# Altium footprint library Connector_Samtec_HLE_SMD.PcbLib: 290 footprints (part 15 of 24) (continued)
## Samtec_HLE-137-02-xxx-DV-LC_2x37_P2.54mm_Horizontal [mm] (continued)
F.CrtYd:
  lines w0.05: -47.49,-4.17 -47.49,4.17 47.49,4.17 47.49,-4.17 -47.49,-4.17
F.Fab:
  lines w0.1: -46.22,2.54 -45.72,1.833 -45.22,2.54 ; -46.99,-2.54 46.99,-2.54 46.99,2.54 -46.99,2.54 -46.99,-2.54
  text "'.Designator'" at -4.047,-2.68 h1

## Samtec_HLE-137-02-xxx-DV_2x37_P2.54mm_Horizontal [mm]
pads (74):
  rect 1.27x2.29 smd: 1(-45.72,2.525) 2(-45.72,-2.525) 3(-43.18,2.525) 4(-43.18,-2.525) 5(-40.64,2.525) 6(-40.64,-2.525) 7(-38.1,2.525) 8(-38.1,-2.525) 9(-35.56,2.525) 10(-35.56,-2.525) 11(-33.02,2.525) 12(-33.02,-2.525) 13(-30.48,2.525) 14(-30.48,-2.525) 15(-27.94,2.525) 16(-27.94,-2.525) 17(-25.4,2.525) 18(-25.4,-2.525) 19(-22.86,2.525) 20(-22.86,-2.525) 21(-20.32,2.525) 22(-20.32,-2.525) 23(-17.78,2.525) 24(-17.78,-2.525) 25(-15.24,2.525) 26(-15.24,-2.525) 27(-12.7,2.525) 28(-12.7,-2.525) 29(-10.16,2.525) 30(-10.16,-2.525) 31(-7.62,2.525) 32(-7.62,-2.525) 33(-5.08,2.525) 34(-5.08,-2.525) 35(-2.54,2.525) 36(-2.54,-2.525) 37(0,2.525) 38(0,-2.525) 39(2.54,2.525) 40(2.54,-2.525) 41(5.08,2.525) 42(5.08,-2.525) 43(7.62,2.525) 44(7.62,-2.525) 45(10.16,2.525) 46(10.16,-2.525) 47(12.7,2.525) 48(12.7,-2.525) 49(15.24,2.525) 50(15.24,-2.525) 51(17.78,2.525) 52(17.78,-2.525) 53(20.32,2.525) 54(20.32,-2.525) 55(22.86,2.525) 56(22.86,-2.525) 57(25.4,2.525) 58(25.4,-2.525) 59(27.94,2.525) 60(27.94,-2.525) 61(30.48,2.525) 62(30.48,-2.525) 63(33.02,2.525) 64(33.02,-2.525) 65(35.56,2.525) 66(35.56,-2.525) 67(38.1,2.525) 68(38.1,-2.525) 69(40.64,2.525) 70(40.64,-2.525) 71(43.18,2.525) 72(43.18,-2.525) 73(45.72,2.525) 74(45.72,-2.525)
F.SilkS:
  lines w0.12: -46.615,-2.65 -47.1,-2.65 -47.1,2.65 -46.615,2.65 -46.615,3.67 ; -44.825,-2.65 -44.075,-2.65 ; -44.825,2.65 -44.075,2.65 ; -42.285,-2.65 -41.535,-2.65 ; -42.285,2.65 -41.535,2.65 ; -39.745,-2.65 -38.995,-2.65 ; -39.745,2.65 -38.995,2.65 ; -37.205,-2.65 -36.455,-2.65 ; -37.205,2.65 -36.455,2.65 ; -34.665,-2.65 -33.915,-2.65 ; -34.665,2.65 -33.915,2.65 ; -32.125,-2.65 -31.375,-2.65 ; -32.125,2.65 -31.375,2.65 ; -29.585,-2.65 -28.835,-2.65 ; -29.585,2.65 -28.835,2.65 ; -27.045,-2.65 -26.295,-2.65 ; -27.045,2.65 -26.295,2.65 ; -24.505,-2.65 -23.755,-2.65 ; -24.505,2.65 -23.755,2.65 ; -21.965,-2.65 -21.215,-2.65 ; -21.965,2.65 -21.215,2.65 ; -19.425,-2.65 -18.675,-2.65 ; -19.425,2.65 -18.675,2.65 ; -16.885,-2.65 -16.135,-2.65 ; -16.885,2.65 -16.135,2.65 ; -14.345,-2.65 -13.595,-2.65 ; -14.345,2.65 -13.595,2.65 ; -11.805,-2.65 -11.055,-2.65 ; -11.805,2.65 -11.055,2.65 ; -9.265,-2.65 -8.515,-2.65 ; -9.265,2.65 -8.515,2.65 ; -6.725,-2.65 -5.975,-2.65 ; -6.725,2.65 -5.975,2.65 ; -4.185,-2.65 -3.435,-2.65 ; -4.185,2.65 -3.435,2.65 ; -1.645,-2.65 -0.895,-2.65 ; -1.645,2.65 -0.895,2.65 ; 0.895,-2.65 1.645,-2.65 ; 0.895,2.65 1.645,2.65 ; 3.435,-2.65 4.185,-2.65 ; 3.435,2.65 4.185,2.65 ; 5.975,-2.65 6.725,-2.65 ; 5.975,2.65 6.725,2.65 ; 8.515,-2.65 9.265,-2.65 ; 8.515,2.65 9.265,2.65 ; 11.055,-2.65 11.805,-2.65 ; 11.055,2.65 11.805,2.65 ; 13.595,-2.65 14.345,-2.65 ; 13.595,2.65 14.345,2.65 ; 16.135,-2.65 16.885,-2.65 ; 16.135,2.65 16.885,2.65 ; 18.675,-2.65 19.425,-2.65 ; 18.675,2.65 19.425,2.65 ; 21.215,-2.65 21.965,-2.65 ; 21.215,2.65 21.965,2.65 ; 23.755,-2.65 24.505,-2.65 ; 23.755,2.65 24.505,2.65 ; 26.295,-2.65 27.045,-2.65 ; 26.295,2.65 27.045,2.65 ; 28.835,-2.65 29.585,-2.65 ; 28.835,2.65 29.585,2.65 ; 31.375,-2.65 32.125,-2.65 ; 31.375,2.65 32.125,2.65 ; 33.915,-2.65 34.665,-2.65 ; 33.915,2.65 34.665,2.65 ; 36.455,-2.65 37.205,-2.65 ; 36.455,2.65 37.205,2.65 ; 38.995,-2.65 39.745,-2.65 ; 38.995,2.65 39.745,2.65 ; 41.535,-2.65 42.285,-2.65 ; 41.535,2.65 42.285,2.65 ; 44.075,-2.65 44.825,-2.65 ; 44.075,2.65 44.825,2.65 ; 46.615,-2.65 47.1,-2.65 47.1,2.65 46.615,2.65
F.CrtYd:
  lines w0.05: -47.49,-4.17 47.49,-4.17 47.49,4.17 -47.49,4.17 -47.49,-4.17
F.Fab:
  lines w0.1: -46.22,2.54 -45.72,1.833 -45.22,2.54 ; -46.99,-2.54 -46.99,2.54 46.99,2.54 46.99,-2.54 -46.99,-2.54
  text "'.Designator'" at -4.047,-2.68 h1

## Samtec_HLE-138-02-xxx-DV-A_2x38_P2.54mm_Horizontal [mm]
pads (78):
  rect 1.27x2.29 smd: 1(-46.99,2.525) 2(-46.99,-2.525) 3(-44.45,2.525) 4(-44.45,-2.525) 5(-41.91,2.525) 6(-41.91,-2.525) 7(-39.37,2.525) 8(-39.37,-2.525) 9(-36.83,2.525) 10(-36.83,-2.525) 11(-34.29,2.525) 12(-34.29,-2.525) 13(-31.75,2.525) 14(-31.75,-2.525) 15(-29.21,2.525) 16(-29.21,-2.525) 17(-26.67,2.525) 18(-26.67,-2.525) 19(-24.13,2.525) 20(-24.13,-2.525) 21(-21.59,2.525) 22(-21.59,-2.525) 23(-19.05,2.525) 24(-19.05,-2.525) 25(-16.51,2.525) 26(-16.51,-2.525) 27(-13.97,2.525) 28(-13.97,-2.525) 29(-11.43,2.525) 30(-11.43,-2.525) 31(-8.89,2.525) 32(-8.89,-2.525) 33(-6.35,2.525) 34(-6.35,-2.525) 35(-3.81,2.525) 36(-3.81,-2.525) 37(-1.27,2.525) 38(-1.27,-2.525) 39(1.27,2.525) 40(1.27,-2.525) 41(3.81,2.525) 42(3.81,-2.525) 43(6.35,2.525) 44(6.35,-2.525) 45(8.89,2.525) 46(8.89,-2.525) 47(11.43,2.525) 48(11.43,-2.525) 49(13.97,2.525) 50(13.97,-2.525) 51(16.51,2.525) 52(16.51,-2.525) 53(19.05,2.525) 54(19.05,-2.525) 55(21.59,2.525) 56(21.59,-2.525) 57(24.13,2.525) 58(24.13,-2.525) 59(26.67,2.525) 60(26.67,-2.525) 61(29.21,2.525) 62(29.21,-2.525) 63(31.75,2.525) 64(31.75,-2.525) 65(34.29,2.525) 66(34.29,-2.525) 67(36.83,2.525) 68(36.83,-2.525) 69(39.37,2.525) 70(39.37,-2.525) 71(41.91,2.525) 72(41.91,-2.525) 73(44.45,2.525) 74(44.45,-2.525) 75(46.99,2.525) 76(46.99,-2.525)
  round 1.78 hole 1.78: Un1(45.72,0) Un2(-45.72,0)
F.SilkS:
  lines w0.12: -47.885,-2.65 -48.37,-2.65 -48.37,2.65 -47.885,2.65 -47.885,3.67 ; -46.095,-2.65 -45.345,-2.65 ; -46.095,2.65 -45.345,2.65 ; -43.555,-2.65 -42.805,-2.65 ; -43.555,2.65 -42.805,2.65 ; -41.015,-2.65 -40.265,-2.65 ; -41.015,2.65 -40.265,2.65 ; -38.475,-2.65 -37.725,-2.65 ; -38.475,2.65 -37.725,2.65 ; -35.935,-2.65 -35.185,-2.65 ; -35.935,2.65 -35.185,2.65 ; -33.395,-2.65 -32.645,-2.65 ; -33.395,2.65 -32.645,2.65 ; -30.855,-2.65 -30.105,-2.65 ; -30.855,2.65 -30.105,2.65 ; -28.315,-2.65 -27.565,-2.65 ; -28.315,2.65 -27.565,2.65 ; -25.775,-2.65 -25.025,-2.65 ; -25.775,2.65 -25.025,2.65 ; -23.235,-2.65 -22.485,-2.65 ; -23.235,2.65 -22.485,2.65 ; -20.695,-2.65 -19.945,-2.65 ; -20.695,2.65 -19.945,2.65 ; -18.155,-2.65 -17.405,-2.65 ; -18.155,2.65 -17.405,2.65 ; -15.615,-2.65 -14.865,-2.65 ; -15.615,2.65 -14.865,2.65 ; -13.075,-2.65 -12.325,-2.65 ; -13.075,2.65 -12.325,2.65 ; -10.535,-2.65 -9.785,-2.65 ; -10.535,2.65 -9.785,2.65 ; -7.995,-2.65 -7.245,-2.65 ; -7.995,2.65 -7.245,2.65 ; -5.455,-2.65 -4.705,-2.65 ; -5.455,2.65 -4.705,2.65 ; -2.915,-2.65 -2.165,-2.65 ; -2.915,2.65 -2.165,2.65 ; -0.375,-2.65 0.375,-2.65 ; -0.375,2.65 0.375,2.65 ; 2.165,-2.65 2.915,-2.65 ; 2.165,2.65 2.915,2.65 ; 4.705,-2.65 5.455,-2.65 ; 4.705,2.65 5.455,2.65 ; 7.245,-2.65 7.995,-2.65 ; 7.245,2.65 7.995,2.65 ; 9.785,-2.65 10.535,-2.65 ; 9.785,2.65 10.535,2.65 ; 12.325,-2.65 13.075,-2.65 ; 12.325,2.65 13.075,2.65 ; 14.865,-2.65 15.615,-2.65 ; 14.865,2.65 15.615,2.65 ; 17.405,-2.65 18.155,-2.65 ; 17.405,2.65 18.155,2.65 ; 19.945,-2.65 20.695,-2.65 ; 19.945,2.65 20.695,2.65 ; 22.485,-2.65 23.235,-2.65 ; 22.485,2.65 23.235,2.65 ; 25.025,-2.65 25.775,-2.65 ; 25.025,2.65 25.775,2.65 ; 27.565,-2.65 28.315,-2.65 ; 27.565,2.65 28.315,2.65 ; 30.105,-2.65 30.855,-2.65 ; 30.105,2.65 30.855,2.65 ; 32.645,-2.65 33.395,-2.65 ; 32.645,2.65 33.395,2.65 ; 35.185,-2.65 35.935,-2.65 ; 35.185,2.65 35.935,2.65 ; 37.725,-2.65 38.475,-2.65 ; 37.725,2.65 38.475,2.65 ; 40.265,-2.65 41.015,-2.65 ; 40.265,2.65 41.015,2.65 ; 42.805,-2.65 43.555,-2.65 ; 42.805,2.65 43.555,2.65 ; 45.345,-2.65 46.095,-2.65 ; 45.345,2.65 46.095,2.65 ; 47.885,-2.65 48.37,-2.65 48.37,2.65 47.885,2.65
F.CrtYd:
  lines w0.05: -48.76,-4.17 48.76,-4.17 48.76,4.17 -48.76,4.17 -48.76,-4.17
F.Fab:
  lines w0.1: -47.49,2.54 -46.99,1.833 -46.49,2.54 ; -48.26,-2.54 48.26,-2.54 48.26,2.54 -48.26,2.54 -48.26,-2.54
  text "'.Designator'" at -4.047,-2.68 h1

## Samtec_HLE-138-02-xxx-DV-BE-A_2x38_P2.54mm_Horizontal [mm]
pads (154):
  rect 1.27x1.68 smd: 1(-46.99,2.72) 2(-46.99,-2.72) 3(-44.45,2.72) 4(-44.45,-2.72) 5(-41.91,2.72) 6(-41.91,-2.72) 7(-39.37,2.72) 8(-39.37,-2.72) 9(-36.83,2.72) 10(-36.83,-2.72) 11(-34.29,2.72) 12(-34.29,-2.72) 13(-31.75,2.72) 14(-31.75,-2.72) 15(-29.21,2.72) 16(-29.21,-2.72) 17(-26.67,2.72) 18(-26.67,-2.72) 19(-24.13,2.72) 20(-24.13,-2.72) 21(-21.59,2.72) 22(-21.59,-2.72) 23(-19.05,2.72) 24(-19.05,-2.72) 25(-16.51,2.72) 26(-16.51,-2.72) 27(-13.97,2.72) 28(-13.97,-2.72) 29(-11.43,2.72) 30(-11.43,-2.72) 31(-8.89,2.72) 32(-8.89,-2.72) 33(-6.35,2.72) 34(-6.35,-2.72) 35(-3.81,2.72) 36(-3.81,-2.72) 37(-1.27,2.72) 38(-1.27,-2.72) 39(1.27,2.72) 40(1.27,-2.72) 41(3.81,2.72) 42(3.81,-2.72) 43(6.35,2.72) 44(6.35,-2.72) 45(8.89,2.72) 46(8.89,-2.72) 47(11.43,2.72) 48(11.43,-2.72) 49(13.97,2.72) 50(13.97,-2.72) 51(16.51,2.72) 52(16.51,-2.72) 53(19.05,2.72) 54(19.05,-2.72) 55(21.59,2.72) 56(21.59,-2.72) 57(24.13,2.72) 58(24.13,-2.72) 59(26.67,2.72) 60(26.67,-2.72) 61(29.21,2.72) 62(29.21,-2.72) 63(31.75,2.72) 64(31.75,-2.72) 65(34.29,2.72) 66(34.29,-2.72) 67(36.83,2.72) 68(36.83,-2.72) 69(39.37,2.72) 70(39.37,-2.72) 71(41.91,2.72) 72(41.91,-2.72) 73(44.45,2.72) 74(44.45,-2.72) 75(46.99,2.72) 76(46.99,-2.72)
  round 0.97 hole 0.97: Un1(-39.37,1.27) Un2(44.45,1.27) Un3(-26.67,1.27) Un4(24.13,1.27) Un5(46.99,-1.27) Un6(-39.37,-1.27) Un7(19.05,-1.27) Un8(11.43,1.27) Un9(-36.83,-1.27) Un10(-36.83,1.27) Un11(39.37,1.27) Un12(-6.35,-1.27) Un13(39.37,-1.27) Un14(29.21,1.27) Un15(-11.43,-1.27) Un16(16.51,1.27) Un17(19.05,1.27) Un18(6.35,1.27) Un19(21.59,-1.27) Un20(8.89,1.27) Un21(36.83,1.27) Un22(-34.29,-1.27) Un23(13.97,-1.27) Un24(-6.35,1.27) Un25(36.83,-1.27) Un26(-44.45,1.27) Un27(-24.13,-1.27) Un28(-24.13,1.27) Un29(1.27,-1.27) Un30(13.97,1.27) Un31(-21.59,1.27) Un32(-13.97,1.27) Un34(41.91,1.27) Un35(24.13,-1.27) Un36(-34.29,1.27) Un37(29.21,-1.27) Un38(26.67,-1.27) Un39(-21.59,-1.27) Un40(-46.99,1.27) Un41(46.99,1.27) Un42(-3.81,1.27) Un43(34.29,1.27) Un44(41.91,-1.27) Un45(-29.21,-1.27) Un46(-46.99,-1.27) Un47(44.45,-1.27) Un48(6.35,-1.27) Un49(-29.21,1.27) Un50(-8.89,1.27) Un51(31.75,-1.27) Un52(-3.81,-1.27) Un53(-1.27,-1.27) Un54(-16.51,-1.27) Un55(-16.51,1.27) Un56(-1.27,1.27) Un57(1.27,1.27) Un58(-26.67,-1.27) Un59(-31.75,-1.27) Un60(-44.45,-1.27) Un61(31.75,1.27) Un62(26.67,1.27) Un63(-31.75,1.27) Un65(-41.91,-1.27) Un66(16.51,-1.27) Un67(-8.89,-1.27) Un68(21.59,1.27) Un69(3.81,1.27) Un70(-19.05,1.27) Un71(8.89,-1.27) Un72(34.29,-1.27) Un73(3.81,-1.27) Un74(-13.97,-1.27) Un75(-19.05,-1.27) Un76(-11.43,1.27) Un77(11.43,-1.27) Un78(-41.91,1.27)
  round 1.78 hole 1.78: Un33(45.72,0) Un64(-45.72,0)
F.SilkS:
  lines w0.12: -47.885,-2.65 -48.37,-2.65 -48.37,2.65 -47.885,2.65 -47.885,3.56 ; -46.095,-2.65 -45.345,-2.65 ; -46.095,2.65 -45.345,2.65 ; -43.555,-2.65 -42.805,-2.65 ; -43.555,2.65 -42.805,2.65 ; -41.015,-2.65 -40.265,-2.65 ; -41.015,2.65 -40.265,2.65 ; -38.475,-2.65 -37.725,-2.65 ; -38.475,2.65 -37.725,2.65 ; -35.935,-2.65 -35.185,-2.65 ; -35.935,2.65 -35.185,2.65 ; -33.395,-2.65 -32.645,-2.65 ; -33.395,2.65 -32.645,2.65 ; -30.855,-2.65 -30.105,-2.65 ; -30.855,2.65 -30.105,2.65 ; -28.315,-2.65 -27.565,-2.65 ; -28.315,2.65 -27.565,2.65 ; -25.775,-2.65 -25.025,-2.65 ; -25.775,2.65 -25.025,2.65 ; -23.235,-2.65 -22.485,-2.65 ; -23.235,2.65 -22.485,2.65 ; -20.695,-2.65 -19.945,-2.65 ; -20.695,2.65 -19.945,2.65 ; -18.155,-2.65 -17.405,-2.65 ; -18.155,2.65 -17.405,2.65 ; -15.615,-2.65 -14.865,-2.65 ; -15.615,2.65 -14.865,2.65 ; -13.075,-2.65 -12.325,-2.65 ; -13.075,2.65 -12.325,2.65 ; -10.535,-2.65 -9.785,-2.65 ; -10.535,2.65 -9.785,2.65 ; -7.995,-2.65 -7.245,-2.65 ; -7.995,2.65 -7.245,2.65 ; -5.455,-2.65 -4.705,-2.65 ; -5.455,2.65 -4.705,2.65 ; -2.915,-2.65 -2.165,-2.65 ; -2.915,2.65 -2.165,2.65 ; -0.375,-2.65 0.375,-2.65 ; -0.375,2.65 0.375,2.65 ; 2.165,-2.65 2.915,-2.65 ; 2.165,2.65 2.915,2.65 ; 4.705,-2.65 5.455,-2.65 ; 4.705,2.65 5.455,2.65 ; 7.245,-2.65 7.995,-2.65 ; 7.245,2.65 7.995,2.65 ; 9.785,-2.65 10.535,-2.65 ; 9.785,2.65 10.535,2.65 ; 12.325,-2.65 13.075,-2.65 ; 12.325,2.65 13.075,2.65 ; 14.865,-2.65 15.615,-2.65 ; 14.865,2.65 15.615,2.65 ; 17.405,-2.65 18.155,-2.65 ; 17.405,2.65 18.155,2.65 ; 19.945,-2.65 20.695,-2.65 ; 19.945,2.65 20.695,2.65 ; 22.485,-2.65 23.235,-2.65 ; 22.485,2.65 23.235,2.65 ; 25.025,-2.65 25.775,-2.65 ; 25.025,2.65 25.775,2.65 ; 27.565,-2.65 28.315,-2.65 ; 27.565,2.65 28.315,2.65 ; 30.105,-2.65 30.855,-2.65 ; 30.105,2.65 30.855,2.65 ; 32.645,-2.65 33.395,-2.65 ; 32.645,2.65 33.395,2.65 ; 35.185,-2.65 35.935,-2.65 ; 35.185,2.65 35.935,2.65 ; 37.725,-2.65 38.475,-2.65 ; 37.725,2.65 38.475,2.65 ; 40.265,-2.65 41.015,-2.65 ; 40.265,2.65 41.015,2.65 ; 42.805,-2.65 43.555,-2.65 ; 42.805,2.65 43.555,2.65 ; 45.345,-2.65 46.095,-2.65 ; 45.345,2.65 46.095,2.65 ; 47.885,-2.65 48.37,-2.65 48.37,2.65 47.885,2.65
F.CrtYd:
  lines w0.05: -48.76,-4.06 48.76,-4.06 48.76,4.06 -48.76,4.06 -48.76,-4.06
F.Fab:
  lines w0.1: -47.49,2.54 -46.99,1.833 -46.49,2.54 ; -48.26,-2.54 48.26,-2.54 48.26,2.54 -48.26,2.54 -48.26,-2.54
  text "'.Designator'" at -4.047,-2.68 h1

## Samtec_HLE-138-02-xxx-DV-BE-LC_2x38_P2.54mm_Horizontal [mm]
pads (154):
  rect 1.27x1.68 smd: 1(-46.99,2.72) 2(-46.99,-2.72) 3(-44.45,2.72) 4(-44.45,-2.72) 5(-41.91,2.72) 6(-41.91,-2.72) 7(-39.37,2.72) 8(-39.37,-2.72) 9(-36.83,2.72) 10(-36.83,-2.72) 11(-34.29,2.72) 12(-34.29,-2.72) 13(-31.75,2.72) 14(-31.75,-2.72) 15(-29.21,2.72) 16(-29.21,-2.72) 17(-26.67,2.72) 18(-26.67,-2.72) 19(-24.13,2.72) 20(-24.13,-2.72) 21(-21.59,2.72) 22(-21.59,-2.72) 23(-19.05,2.72) 24(-19.05,-2.72) 25(-16.51,2.72) 26(-16.51,-2.72) 27(-13.97,2.72) 28(-13.97,-2.72) 29(-11.43,2.72) 30(-11.43,-2.72) 31(-8.89,2.72) 32(-8.89,-2.72) 33(-6.35,2.72) 34(-6.35,-2.72) 35(-3.81,2.72) 36(-3.81,-2.72) 37(-1.27,2.72) 38(-1.27,-2.72) 39(1.27,2.72) 40(1.27,-2.72) 41(3.81,2.72) 42(3.81,-2.72) 43(6.35,2.72) 44(6.35,-2.72) 45(8.89,2.72) 46(8.89,-2.72) 47(11.43,2.72) 48(11.43,-2.72) 49(13.97,2.72) 50(13.97,-2.72) 51(16.51,2.72) 52(16.51,-2.72) 53(19.05,2.72) 54(19.05,-2.72) 55(21.59,2.72) 56(21.59,-2.72) 57(24.13,2.72) 58(24.13,-2.72) 59(26.67,2.72) 60(26.67,-2.72) 61(29.21,2.72) 62(29.21,-2.72) 63(31.75,2.72) 64(31.75,-2.72) 65(34.29,2.72) 66(34.29,-2.72) 67(36.83,2.72) 68(36.83,-2.72) 69(39.37,2.72) 70(39.37,-2.72) 71(41.91,2.72) 72(41.91,-2.72) 73(44.45,2.72) 74(44.45,-2.72) 75(46.99,2.72) 76(46.99,-2.72)
  round 1.19 hole 1.19: Un1(45.72,0) Un12(-45.72,0)
  round 0.97 hole 0.97: Un2(13.97,1.27) Un3(11.43,-1.27) Un4(-21.59,-1.27) Un5(6.35,1.27) Un6(-26.67,-1.27) Un7(-16.51,1.27) Un8(26.67,-1.27) Un9(-44.45,1.27) Un10(-41.91,-1.27) Un11(3.81,1.27) Un13(8.89,1.27) Un14(-29.21,1.27) Un15(44.45,-1.27) Un16(-34.29,1.27) Un17(-11.43,1.27) Un18(-8.89,1.27) Un19(31.75,1.27) Un20(1.27,1.27) Un21(21.59,-1.27) Un22(41.91,-1.27) Un23(16.51,1.27) Un24(8.89,-1.27) Un25(-36.83,1.27) Un26(34.29,-1.27) Un27(21.59,1.27) Un28(29.21,1.27) Un29(16.51,-1.27) Un30(-1.27,-1.27) Un31(-24.13,-1.27) Un32(19.05,-1.27) Un33(13.97,-1.27) Un34(-11.43,-1.27) Un35(39.37,1.27) Un36(24.13,-1.27) Un37(-19.05,1.27) Un38(1.27,-1.27) Un39(-3.81,1.27) Un40(-24.13,1.27) Un41(41.91,1.27) Un42(-39.37,-1.27) Un43(36.83,-1.27) Un44(-39.37,1.27) Un45(39.37,-1.27) Un46(-46.99,-1.27) Un47(24.13,1.27) Un48(-13.97,-1.27) Un49(-26.67,1.27) Un50(44.45,1.27) Un51(19.05,1.27) Un52(36.83,1.27) Un53(11.43,1.27) Un54(-34.29,-1.27) Un55(-21.59,1.27) Un56(26.67,1.27) Un57(-36.83,-1.27) Un58(46.99,1.27) Un59(-46.99,1.27) Un60(-41.91,1.27) Un61(3.81,-1.27) Un62(-19.05,-1.27) Un63(-3.81,-1.27) Un64(-31.75,-1.27) Un65(-16.51,-1.27) Un66(-13.97,1.27) Un67(31.75,-1.27) Un68(-8.89,-1.27) Un69(-29.21,-1.27) Un70(-6.35,-1.27) Un71(6.35,-1.27) Un72(-6.35,1.27) Un73(34.29,1.27) Un74(29.21,-1.27) Un75(-44.45,-1.27) Un76(-1.27,1.27) Un77(-31.75,1.27) Un78(46.99,-1.27)
F.SilkS:
  lines w0.12: -47.885,-2.65 -48.37,-2.65 -48.37,2.65 -47.885,2.65 -47.885,3.56 ; -46.095,-2.65 -45.345,-2.65 ; -46.095,2.65 -45.345,2.65 ; -43.555,-2.65 -42.805,-2.65 ; -43.555,2.65 -42.805,2.65 ; -41.015,-2.65 -40.265,-2.65 ; -41.015,2.65 -40.265,2.65 ; -38.475,-2.65 -37.725,-2.65 ; -38.475,2.65 -37.725,2.65 ; -35.935,-2.65 -35.185,-2.65 ; -35.935,2.65 -35.185,2.65 ; -33.395,-2.65 -32.645,-2.65 ; -33.395,2.65 -32.645,2.65 ; -30.855,-2.65 -30.105,-2.65 ; -30.855,2.65 -30.105,2.65 ; -28.315,-2.65 -27.565,-2.65 ; -28.315,2.65 -27.565,2.65 ; -25.775,-2.65 -25.025,-2.65 ; -25.775,2.65 -25.025,2.65 ; -23.235,-2.65 -22.485,-2.65 ; -23.235,2.65 -22.485,2.65 ; -20.695,-2.65 -19.945,-2.65 ; -20.695,2.65 -19.945,2.65 ; -18.155,-2.65 -17.405,-2.65 ; -18.155,2.65 -17.405,2.65 ; -15.615,-2.65 -14.865,-2.65 ; -15.615,2.65 -14.865,2.65 ; -13.075,-2.65 -12.325,-2.65 ; -13.075,2.65 -12.325,2.65 ; -10.535,-2.65 -9.785,-2.65 ; -10.535,2.65 -9.785,2.65 ; -7.995,-2.65 -7.245,-2.65 ; -7.995,2.65 -7.245,2.65 ; -5.455,-2.65 -4.705,-2.65 ; -5.455,2.65 -4.705,2.65 ; -2.915,-2.65 -2.165,-2.65 ; -2.915,2.65 -2.165,2.65 ; -0.375,-2.65 0.375,-2.65 ; -0.375,2.65 0.375,2.65 ; 2.165,-2.65 2.915,-2.65 ; 2.165,2.65 2.915,2.65 ; 4.705,-2.65 5.455,-2.65 ; 4.705,2.65 5.455,2.65 ; 7.245,-2.65 7.995,-2.65 ; 7.245,2.65 7.995,2.65 ; 9.785,-2.65 10.535,-2.65 ; 9.785,2.65 10.535,2.65 ; 12.325,-2.65 13.075,-2.65 ; 12.325,2.65 13.075,2.65 ; 14.865,-2.65 15.615,-2.65 ; 14.865,2.65 15.615,2.65 ; 17.405,-2.65 18.155,-2.65 ; 17.405,2.65 18.155,2.65 ; 19.945,-2.65 20.695,-2.65 ; 19.945,2.65 20.695,2.65 ; 22.485,-2.65 23.235,-2.65 ; 22.485,2.65 23.235,2.65 ; 25.025,-2.65 25.775,-2.65 ; 25.025,2.65 25.775,2.65 ; 27.565,-2.65 28.315,-2.65 ; 27.565,2.65 28.315,2.65 ; 30.105,-2.65 30.855,-2.65 ; 30.105,2.65 30.855,2.65 ; 32.645,-2.65 33.395,-2.65 ; 32.645,2.65 33.395,2.65 ; 35.185,-2.65 35.935,-2.65 ; 35.185,2.65 35.935,2.65 ; 37.725,-2.65 38.475,-2.65 ; 37.725,2.65 38.475,2.65 ; 40.265,-2.65 41.015,-2.65 ; 40.265,2.65 41.015,2.65 ; 42.805,-2.65 43.555,-2.65 ; 42.805,2.65 43.555,2.65 ; 45.345,-2.65 46.095,-2.65 ; 45.345,2.65 46.095,2.65 ; 47.885,-2.65 48.37,-2.65 48.37,2.65 47.885,2.65
F.CrtYd:
  lines w0.05: -48.76,-4.06 48.76,-4.06 48.76,4.06 -48.76,4.06 -48.76,-4.06
F.Fab:
  lines w0.1: -47.49,2.54 -46.99,1.833 -46.49,2.54 ; -48.26,-2.54 -48.26,2.54 48.26,2.54 48.26,-2.54 -48.26,-2.54
  text "'.Designator'" at -4.047,-2.68 h1

## Samtec_HLE-138-02-xxx-DV-BE_2x38_P2.54mm_Horizontal [mm]
pads (152):
  rect 1.27x1.68 smd: 1(-46.99,2.72) 2(-46.99,-2.72) 3(-44.45,2.72) 4(-44.45,-2.72) 5(-41.91,2.72) 6(-41.91,-2.72) 7(-39.37,2.72) 8(-39.37,-2.72) 9(-36.83,2.72) 10(-36.83,-2.72) 11(-34.29,2.72) 12(-34.29,-2.72) 13(-31.75,2.72) 14(-31.75,-2.72) 15(-29.21,2.72) 16(-29.21,-2.72) 17(-26.67,2.72) 18(-26.67,-2.72) 19(-24.13,2.72) 20(-24.13,-2.72) 21(-21.59,2.72) 22(-21.59,-2.72) 23(-19.05,2.72) 24(-19.05,-2.72) 25(-16.51,2.72) 26(-16.51,-2.72) 27(-13.97,2.72) 28(-13.97,-2.72) 29(-11.43,2.72) 30(-11.43,-2.72) 31(-8.89,2.72) 32(-8.89,-2.72) 33(-6.35,2.72) 34(-6.35,-2.72) 35(-3.81,2.72) 36(-3.81,-2.72) 37(-1.27,2.72) 38(-1.27,-2.72) 39(1.27,2.72) 40(1.27,-2.72) 41(3.81,2.72) 42(3.81,-2.72) 43(6.35,2.72) 44(6.35,-2.72) 45(8.89,2.72) 46(8.89,-2.72) 47(11.43,2.72) 48(11.43,-2.72) 49(13.97,2.72) 50(13.97,-2.72) 51(16.51,2.72) 52(16.51,-2.72) 53(19.05,2.72) 54(19.05,-2.72) 55(21.59,2.72) 56(21.59,-2.72) 57(24.13,2.72) 58(24.13,-2.72) 59(26.67,2.72) 60(26.67,-2.72) 61(29.21,2.72) 62(29.21,-2.72) 63(31.75,2.72) 64(31.75,-2.72) 65(34.29,2.72) 66(34.29,-2.72) 67(36.83,2.72) 68(36.83,-2.72) 69(39.37,2.72) 70(39.37,-2.72) 71(41.91,2.72) 72(41.91,-2.72) 73(44.45,2.72) 74(44.45,-2.72) 75(46.99,2.72) 76(46.99,-2.72)
  round 0.97 hole 0.97: Un1(-36.83,1.27) Un2(-1.27,1.27) Un3(8.89,-1.27) Un4(-13.97,-1.27) Un5(3.81,1.27) Un6(-3.81,-1.27) Un7(-6.35,1.27) Un8(46.99,-1.27) Un9(-19.05,-1.27) Un10(36.83,-1.27) Un11(29.21,-1.27) Un12(26.67,-1.27) Un13(-13.97,1.27) Un14(3.81,-1.27) Un15(-41.91,1.27) Un16(39.37,1.27) Un17(-11.43,-1.27) Un18(31.75,-1.27) Un19(-1.27,-1.27) Un20(1.27,1.27) Un21(-16.51,1.27) Un22(-46.99,-1.27) Un23(-29.21,-1.27) Un24(13.97,1.27) Un25(-44.45,1.27) Un26(1.27,-1.27) Un27(-8.89,1.27) Un28(26.67,1.27) Un29(16.51,1.27) Un30(21.59,-1.27) Un31(-39.37,1.27) Un32(21.59,1.27) Un33(-21.59,-1.27) Un34(-11.43,1.27) Un35(46.99,1.27) Un36(-36.83,-1.27) Un37(39.37,-1.27) Un38(31.75,1.27) Un39(-31.75,1.27) Un40(-3.81,1.27) Un41(-44.45,-1.27) Un42(24.13,-1.27) Un43(34.29,1.27) Un44(-34.29,-1.27) Un45(11.43,-1.27) Un46(-16.51,-1.27) Un47(41.91,1.27) Un48(-24.13,-1.27) Un49(-31.75,-1.27) Un50(-19.05,1.27) Un51(-6.35,-1.27) Un52(16.51,-1.27) Un53(6.35,-1.27) Un54(19.05,-1.27) Un55(13.97,-1.27) Un56(41.91,-1.27) Un57(19.05,1.27) Un58(6.35,1.27) Un59(29.21,1.27) Un60(-29.21,1.27) Un61(-26.67,-1.27) Un62(-8.89,-1.27) Un63(-21.59,1.27) Un64(44.45,1.27) Un65(-24.13,1.27) Un66(-39.37,-1.27) Un67(11.43,1.27) Un68(-26.67,1.27) Un69(36.83,1.27) Un70(8.89,1.27) Un71(44.45,-1.27) Un72(24.13,1.27) Un73(-46.99,1.27) Un74(-34.29,1.27) Un75(34.29,-1.27) Un76(-41.91,-1.27)
F.SilkS:
  lines w0.12: -47.885,-2.65 -48.37,-2.65 -48.37,2.65 -47.885,2.65 -47.885,3.56 ; -46.095,-2.65 -45.345,-2.65 ; -46.095,2.65 -45.345,2.65 ; -43.555,-2.65 -42.805,-2.65 ; -43.555,2.65 -42.805,2.65 ; -41.015,-2.65 -40.265,-2.65 ; -41.015,2.65 -40.265,2.65 ; -38.475,-2.65 -37.725,-2.65 ; -38.475,2.65 -37.725,2.65 ; -35.935,-2.65 -35.185,-2.65 ; -35.935,2.65 -35.185,2.65 ; -33.395,-2.65 -32.645,-2.65 ; -33.395,2.65 -32.645,2.65 ; -30.855,-2.65 -30.105,-2.65 ; -30.855,2.65 -30.105,2.65 ; -28.315,-2.65 -27.565,-2.65 ; -28.315,2.65 -27.565,2.65 ; -25.775,-2.65 -25.025,-2.65 ; -25.775,2.65 -25.025,2.65 ; -23.235,-2.65 -22.485,-2.65 ; -23.235,2.65 -22.485,2.65 ; -20.695,-2.65 -19.945,-2.65 ; -20.695,2.65 -19.945,2.65 ; -18.155,-2.65 -17.405,-2.65 ; -18.155,2.65 -17.405,2.65 ; -15.615,-2.65 -14.865,-2.65 ; -15.615,2.65 -14.865,2.65 ; -13.075,-2.65 -12.325,-2.65 ; -13.075,2.65 -12.325,2.65 ; -10.535,-2.65 -9.785,-2.65 ; -10.535,2.65 -9.785,2.65 ; -7.995,-2.65 -7.245,-2.65 ; -7.995,2.65 -7.245,2.65 ; -5.455,-2.65 -4.705,-2.65 ; -5.455,2.65 -4.705,2.65 ; -2.915,-2.65 -2.165,-2.65 ; -2.915,2.65 -2.165,2.65 ; -0.375,-2.65 0.375,-2.65 ; -0.375,2.65 0.375,2.65 ; 2.165,-2.65 2.915,-2.65 ; 2.165,2.65 2.915,2.65 ; 4.705,-2.65 5.455,-2.65 ; 4.705,2.65 5.455,2.65 ; 7.245,-2.65 7.995,-2.65 ; 7.245,2.65 7.995,2.65 ; 9.785,-2.65 10.535,-2.65 ; 9.785,2.65 10.535,2.65 ; 12.325,-2.65 13.075,-2.65 ; 12.325,2.65 13.075,2.65 ; 14.865,-2.65 15.615,-2.65 ; 14.865,2.65 15.615,2.65 ; 17.405,-2.65 18.155,-2.65 ; 17.405,2.65 18.155,2.65 ; 19.945,-2.65 20.695,-2.65 ; 19.945,2.65 20.695,2.65 ; 22.485,-2.65 23.235,-2.65 ; 22.485,2.65 23.235,2.65 ; 25.025,-2.65 25.775,-2.65 ; 25.025,2.65 25.775,2.65 ; 27.565,-2.65 28.315,-2.65 ; 27.565,2.65 28.315,2.65 ; 30.105,-2.65 30.855,-2.65 ; 30.105,2.65 30.855,2.65 ; 32.645,-2.65 33.395,-2.65 ; 32.645,2.65 33.395,2.65 ; 35.185,-2.65 35.935,-2.65 ; 35.185,2.65 35.935,2.65 ; 37.725,-2.65 38.475,-2.65 ; 37.725,2.65 38.475,2.65 ; 40.265,-2.65 41.015,-2.65 ; 40.265,2.65 41.015,2.65 ; 42.805,-2.65 43.555,-2.65 ; 42.805,2.65 43.555,2.65 ; 45.345,-2.65 46.095,-2.65 ; 45.345,2.65 46.095,2.65 ; 47.885,-2.65 48.37,-2.65 48.37,2.65 47.885,2.65
F.CrtYd:
  lines w0.05: -48.76,-4.06 48.76,-4.06 48.76,4.06 -48.76,4.06 -48.76,-4.06
F.Fab:
  lines w0.1: -47.49,2.54 -46.99,1.833 -46.49,2.54 ; -48.26,-2.54 48.26,-2.54 48.26,2.54 -48.26,2.54 -48.26,-2.54
  text "'.Designator'" at -4.047,-2.68 h1